# Altium footprint library Footprints.PcbLib: 50 footprints (part 3 of 4)
Each footprint in its own frame and in the unit in brackets; x right, y up, seen from the top. Pads: shape width x height; smd on the part's side, far side on the other; paste and mask are expansions set on the pad; w line width, h text height; cw(c..) or ccw(c..) is an arc to the next point about the centre after c.
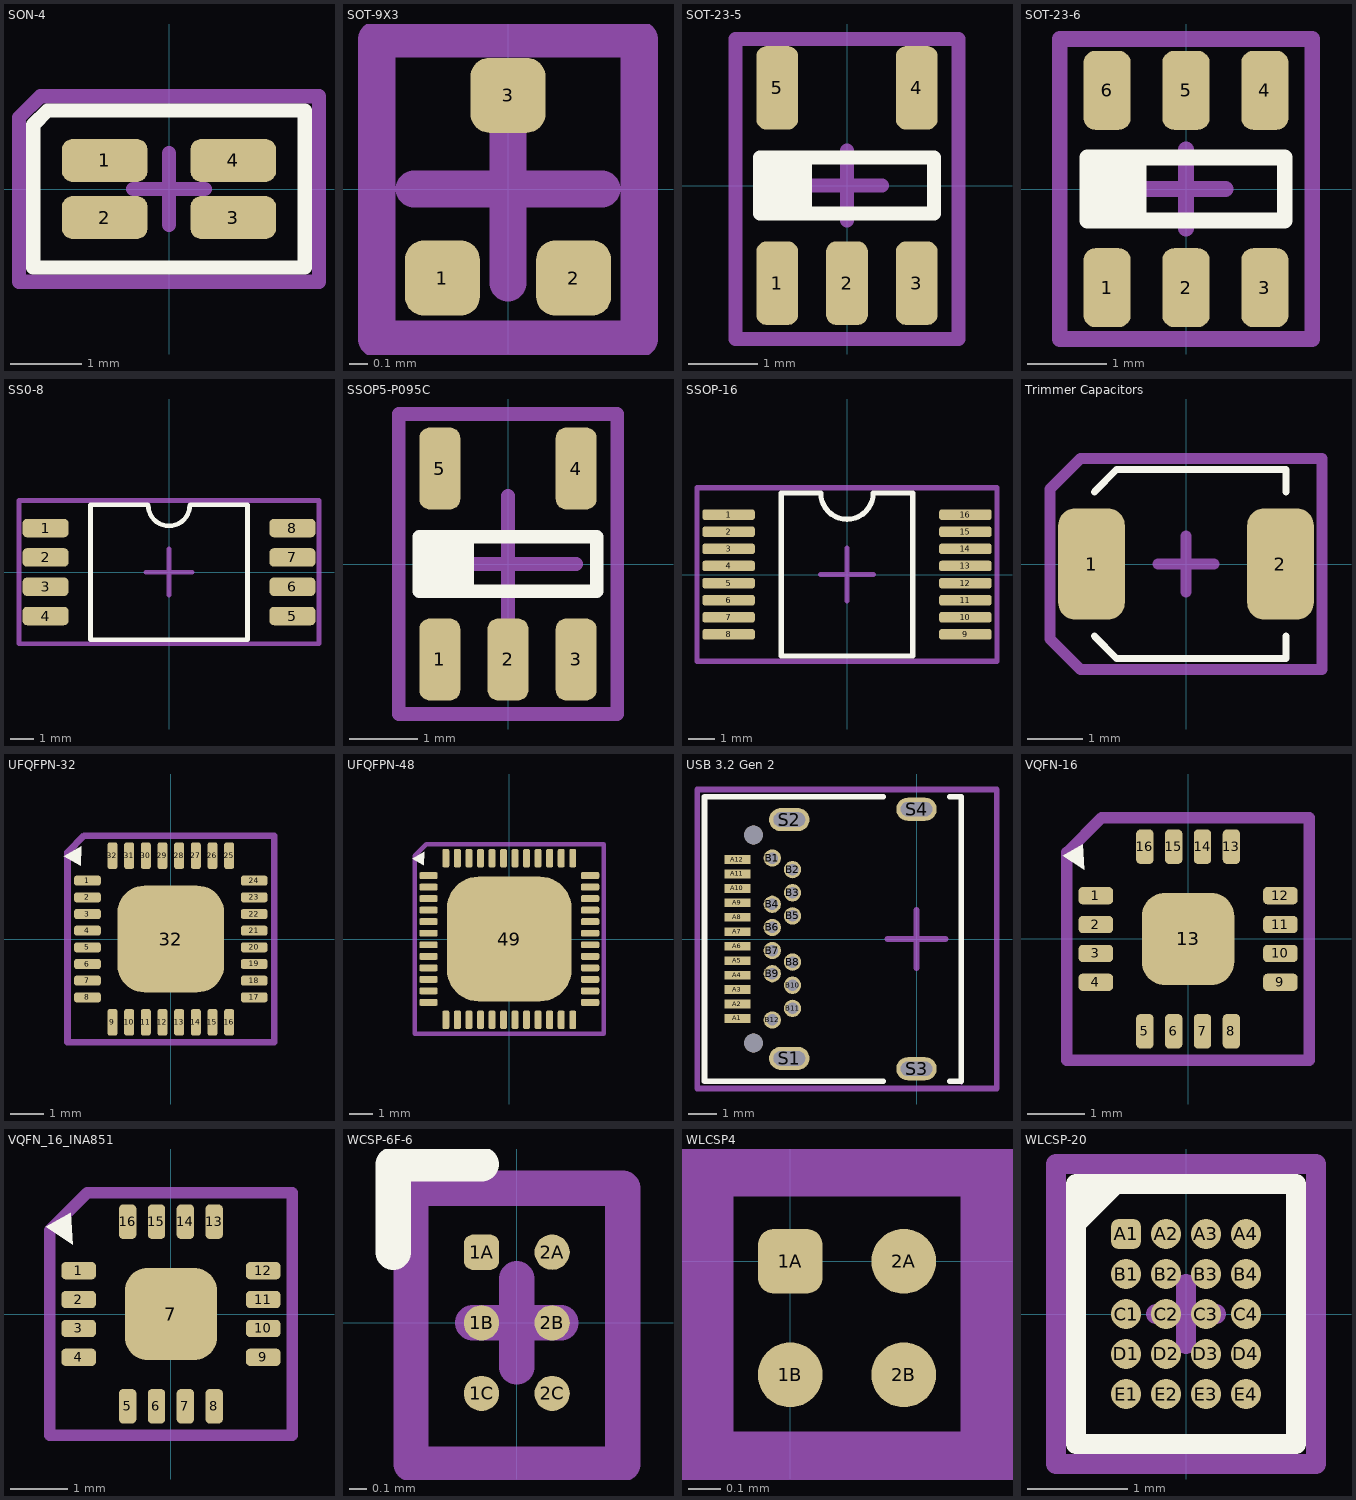
[diagram p2: the footprints below, top view; thin cyan lines are the x and y axes]

## SON-4 [mm]
pads (4):
  rrect50% 1.2x0.6 smd mask+0.051: 1(-0.9,0.4) 2(-0.9,-0.4) 3(0.9,-0.4) 4(0.9,0.4)
Top Overlay:
  lines w0.2: -1.9,-1.1 1.9,-1.1 1.9,1.1 -1.7,1.1 -1.9,0.9 -1.9,-1.1
Top Solder:
  rectangle: -1.6,-0.8 1.6,0.8
Top Assembly:
  lines w0.2: -0.5,0 0.5,0 ; 0,-0.5 0,0.5 ; -2.1,-1.3 -2.1,1 -1.8,1.3 2.1,1.3 2.1,-1.3 -2.1,-1.3
  text "'.Designator'" at -1.795,1.378 h1
3D body "VSONR4_TOS.step": height 1.4, standoff 0, extent -1.372,-0.724 1.372,0.724

## SOT-9X3 [mm]
pads (3):
  rrect50% 0.4x0.4 smd mask+0.051: 1(-0.35,-0.475) 2(0.35,-0.475) 3(0,0.5)
Top Assembly:
  lines w0.2: -0.5,0 0.5,0 ; 0,-0.5 0,0.5 ; -0.7,-0.8 -0.7,0.8 0.7,0.8 0.7,-0.8 -0.7,-0.8
  text "'.Designator'" at -1.795,0.978 h1
3D body "DRT0003A.stp": height 0.5, standoff 0, extent -0.5,-0.505 0.5,0.495

## SOT-23-5 [mm]
pads (5):
  rrect50% 0.6x1.2 smd mask+0.051: 1(-1,-1.4) 2(0,-1.4) 3(1,-1.4) 4(1,1.4) 5(-1,1.4)
Top Overlay:
  rectangle: -1.25,-0.4 -0.5,0.4
  lines w0.2: -1.25,-0.4 1.25,-0.4 1.25,0.4 -1.25,0.4 -1.25,-0.4
Top Assembly:
  lines w0.2: -0.5,0 0.5,0 ; 0,-0.5 0,0.5 ; -1.6,-2.2 -1.6,2.1 1.6,2.1 1.6,-2.2 -1.6,-2.2
  text "'.Designator'" at -1.695,2.378 h1
3D body "CircuitWorks-SOT-23-5.step": height 1.05, standoff -0.05, extent -1.5,-1.25 1.5,1.25

## SOT-23-6 [mm]
pads (6):
  rrect50% 0.6x1 smd mask+0.051: 1(-1,-1.25) 2(0,-1.25) 3(1,-1.25) 4(1,1.25) 5(0,1.25) 6(-1,1.25)
Top Overlay:
  rectangle: -1.25,-0.4 -0.5,0.4
  lines w0.2: -1.25,-0.4 -1.25,0.4 1.25,0.4 1.25,-0.4 -1.25,-0.4
Top Assembly:
  lines w0.2: -0.5,0 0.5,0 ; 0,-0.5 0,0.5 ; -1.6,-1.9 1.6,-1.9 1.6,1.9 -1.6,1.9 -1.6,-1.9
  text "'.Designator'" at -1.72,2.078 h1
3D body "User Library-SOT23-6-1.step": height 1.09, standoff 0, extent -1.397,-1.2 1.397,1.226

## SS0-8 [mm]
pads (8):
  rrect50% 2x0.8 smd mask+0.051: 1(-5.35,1.905) 2(-5.35,0.635) 3(-5.35,-0.635) 4(-5.35,-1.905) 5(5.35,-1.905) 6(5.35,-0.635) 7(5.35,0.635) 8(5.35,1.905)
Top Overlay:
  lines w0.2: -0.925,2.925 -3.404,2.925 -3.404,-2.925 3.404,-2.925 3.404,2.925 0.925,2.925 ; -0.9,2.9 ccw(c0,2.9) 0,2 ccw(c0,2.9) 0.9,2.9
Top Assembly:
  lines w0.2: -1,0 1,0 ; 0,-1 0,1 ; -6.5,-3.1 -6.5,3.1 6.5,3.1 6.5,-3.1 -6.5,-3.1
  text "'.Designator'" at -1.72,2.078 h1
3D body "User Library-SSO-8.step": height 3.09, standoff -0.29, extent -5.75,-2.85 5.75,3

## SSOP5-P095C [mm]
pads (5):
  rrect50% 0.6x1.2 smd mask+0.051: 1(-1,-1.4) 2(0,-1.4) 3(1,-1.4) 4(1,1.4) 5(-1,1.4)
Top Overlay:
  rectangle: -1.3,-0.4 -0.5,0.4
  lines w0.2: -1.3,-0.4 -1.3,0.4 1.3,0.4 1.3,-0.4 -1.3,-0.4
Top Assembly:
  lines w0.2: -1,0 1,0 ; 0,-1 0,1 ; -1.6,-2.2 1.6,-2.2 1.6,2.2 -1.6,2.2 -1.6,-2.2
  text "'.Designator'" at -1.795,2.378 h1
3D body "User Library-TC7S04F - SS05-P-0_95.step": height 1.1, standoff 0, extent -1.45,-1.4 1.45,1.4

## SSOP-16 [mm]
pads (16):
  rrect50% 2x0.4 smd mask+0.051: 1(-4.5,2.275) 2(-4.5,1.625) 3(-4.5,0.975) 4(-4.5,0.325) 5(-4.5,-0.325) 6(-4.5,-0.975) 7(-4.5,-1.625) 8(-4.5,-2.275) 9(4.5,-2.275) 10(4.5,-1.625) 11(4.5,-0.975) 12(4.5,-0.325) 13(4.5,0.325) 14(4.5,0.975) 15(4.5,1.625) 16(4.5,2.275)
Top Overlay:
  lines w0.2: 0,2.1 cw(c0,3.1) -1,3.1 -2.5,3.1 -2.5,-3.1 2.5,-3.1 2.5,3.1 1,3.1 cw(c0,3.1) 0,2.1 ; 0,2.1 0,2.1
Top Solder:
  rectangle: 3.4,-2.6 5.6,2.6
  rectangle: -5.6,-2.6 -3.4,2.6
Top Assembly:
  lines w0.2: -1,0 1,0 ; 0,-1 0,1 ; -5.7,-3.3 5.7,-3.3 5.7,3.3 -5.7,3.3 -5.7,-3.3
  text "'.Designator'" at -1.695,2.078 h1
3D body "User Library-ssop-16 pos.step": height 2.09, standoff 0.11, extent -3.95,-3.162 3.95,3.162

## Trimmer Capacitors [mm]
pads (2):
  rrect50% 1.2x2 smd mask+0.051: 1(-1.7,0) 2(1.7,0)
Top Overlay:
  lines w0.127: -1.65,-1.3 -1.249,-1.7 1.8,-1.7 1.8,-1.3 ; -1.65,1.3 -1.249,1.7 1.8,1.7 1.8,1.3
Top Assembly:
  lines w0.2: -0.5,0 0.5,0 ; 0,-0.5 0,0.5 ; -2.45,-1.35 -1.9,-1.9 2.45,-1.9 2.45,1.9 -1.9,1.9 -2.45,1.35 -2.45,-1.35
  text "'.Designator'" at -1.795,1.078 h1
3D body "User Library-CAPAE450X150M.step": height 1.5, standoff 0, extent -2.25,-1.6 2.25,1.6

## UFQFPN-32 [mm]
pads (33):
  rrect50% 0.8x0.3 smd mask+0.051: 1(-2.5,1.75) 2(-2.5,1.25) 3(-2.5,0.75) 4(-2.5,0.25) 5(-2.5,-0.25) 6(-2.5,-0.75) 7(-2.5,-1.25) 8(-2.5,-1.75) 17(2.5,-1.75) 18(2.5,-1.25) 19(2.5,-0.75) 20(2.5,-0.25) 21(2.5,0.25) 22(2.5,0.75) 23(2.5,1.25) 24(2.5,1.75)
  rrect50% 0.3x0.8 smd mask+0.051: 9(-1.75,-2.5) 10(-1.25,-2.5) 11(-0.75,-2.5) 12(-0.25,-2.5) 13(0.25,-2.5) 14(0.75,-2.5) 15(1.25,-2.5) 16(1.75,-2.5) 25(1.75,2.5) 26(1.25,2.5) 27(0.75,2.5) 28(0.25,2.5) 29(-0.25,2.5) 30(-0.75,2.5) 31(-1.25,2.5) 32(-1.75,2.5)
  rrect50% 3.2x3.2 smd mask+0.051: 32(0,0)
Top Overlay:
  region: -2.7,2.2 -2.69,2.783 -3.21,2.483
Top Solder:
  region: -2,3 -2,2 2,2 2,3
  region: 3,2 2,2 2,-2 3,-2
  region: 2,-3 2,-2 -2,-2 -2,-3
  rectangle: -3,-2 -2,2
Top Assembly:
  lines w0.2: -0.5,0 0.5,0 ; 0,-0.5 0,0.5 ; -3.1,-3.1 3.1,-3.1 3.1,3.1 -2.6,3.1 -3.1,2.6 -3.1,-3.1
  text "'.Designator'" at -1.895,3.678 h1
3D body "User Library-UFQFPN-32.step": height 0.55, standoff 0, extent -2.5,-2.5 2.5,2.5

## UFQFPN-48 [mm]
pads (49):
  rrect50% 0.8x0.3 smd mask+0.051: 1(-3.5,2.75) 2(-3.5,2.25) 3(-3.5,1.75) 4(-3.5,1.25) 5(-3.5,0.75) 6(-3.5,0.25) 7(-3.5,-0.25) 8(-3.5,-0.75) 9(-3.5,-1.25) 10(-3.5,-1.75) 11(-3.5,-2.25) 12(-3.5,-2.75) 25(3.5,-2.75) 26(3.5,-2.25) 27(3.5,-1.75) 28(3.5,-1.25) 29(3.5,-0.75) 30(3.5,-0.25) 31(3.5,0.25) 32(3.5,0.75) 33(3.5,1.25) 34(3.5,1.75) 35(3.5,2.25) 36(3.5,2.75)
  rrect50% 0.3x0.8 smd mask+0.051: 13(-2.75,-3.5) 14(-2.25,-3.5) 15(-1.75,-3.5) 16(-1.25,-3.5) 17(-0.75,-3.5) 18(-0.25,-3.5) 19(0.25,-3.5) 20(0.75,-3.5) 21(1.25,-3.5) 22(1.75,-3.5) 23(2.25,-3.5) 24(2.75,-3.5) 37(2.75,3.5) 38(2.25,3.5) 39(1.75,3.5) 40(1.25,3.5) 41(0.75,3.5) 42(0.25,3.5) 43(-0.25,3.5) 44(-0.75,3.5) 45(-1.25,3.5) 46(-1.75,3.5) 47(-2.25,3.5) 48(-2.75,3.5)
  rrect50% 5.4x5.4 smd mask+0.051: 49(0,0)
Top Overlay:
  region: -3.7,3.2 -3.69,3.783 -4.21,3.483
Top Solder:
  rectangle: -4,-3 -3,3
  region: -3,-3 -3,-4 3,-4 3,-3
  rectangle: 3,-3 4,3
  region: 3,3 3,4 -3,4 -3,3
Top Assembly:
  lines w0.2: -0.5,0 0.5,0 ; 0,-0.5 0,0.5 ; -4.1,-4.1 -4.1,3.6 -3.6,4.1 4.1,4.1 4.1,-4.1 -4.1,-4.1
  text "'.Designator'" at -1.795,4.378 h1
3D body "QFPN_491CCU6_STM.step": height 0.61, standoff 0, extent -3.556,-3.556 3.556,3.556

## USB 3.2 Gen 2 [mm]
pads (30):
  rect 0.9x0.3 smd mask+0.051: A1(-6.2,-2.75) A2(-6.2,-2.25) A3(-6.2,-1.75) A4(-6.2,-1.25) A5(-6.2,-0.75) A6(-6.2,-0.25) A7(-6.2,0.25) A8(-6.2,0.75) A9(-6.2,1.25) A10(-6.2,1.75) A11(-6.2,2.25) A12(-6.2,2.75)
  round 0.6 hole 0.4: B1(-4.99,2.8) B2(-4.29,2.4) B3(-4.29,1.6) B4(-4.99,1.2) B5(-4.29,0.8) B6(-4.99,0.4) B7(-4.99,-0.4) B8(-4.29,-0.8) B9(-4.99,-1.2) B10(-4.29,-1.6) B11(-4.29,-2.4) B12(-4.99,-2.8)
  oval 1.4x0.8 hole 0.5 slot 1.1 at 0 deg: S1(-4.4,-4.13) S2(-4.4,4.13) S3(0,-4.49) S4(0,4.49)
  round 0.65 hole 0.65 unplated: ""(-5.64,-3.6) ""(-5.64,3.6)
Top Overlay:
  lines w0.2: -1.15,-4.925 -7.34,-4.925 -7.34,4.925 -1.15,4.925 ; 1.15,-4.925 1.55,-4.925 1.55,4.925 1.15,4.925
Top Solder:
  rectangle: -6.7,-4 -3.9,4
Top Assembly:
  lines w0.1: 1.55,-5 1.55,4.75
  lines w0.2: -1,0 1,0 ; 0,-1 0,1 ; -7.59,-5.175 2.78,-5.175 2.78,5.175 -7.59,5.175 -7.59,-5.175
  text "'.Designator'" at -2.795,1.778 h1
3D body "USB4056-03-A.stp": height 3.33, standoff -1.13, extent -7.27,-4.925 2.6,4.925

## VQFN-16 [mm]
pads (17):
  rrect50% 0.6x0.3 smd mask+0.051: 1(-1.6,0.75) 2(-1.6,0.25) 3(-1.6,-0.25) 4(-1.6,-0.75) 9(1.6,-0.75) 10(1.6,-0.25) 11(1.6,0.25) 12(1.6,0.75)
  rrect50% 0.3x0.6 smd mask+0.051: 5(-0.75,-1.6) 6(-0.25,-1.6) 7(0.25,-1.6) 8(0.75,-1.6) 13(0.75,1.6) 14(0.25,1.6) 15(-0.25,1.6) 16(-0.75,1.6)
  rrect50% 1.6x1.6 smd mask+0.051: 13(0,0)
Top Overlay:
  region: -1.8,1.2 -1.827,1.646 -2.173,1.446
Top Solder:
  rectangle: -2,-1 -1.2,1
  region: -1,-1.2 -1,-2 1,-2 1,-1.2
  rectangle: 1.2,-1 2,1
  region: 1,1.2 1,2 -1,2 -1,1.2
Top Assembly:
  lines w0.2: -0.25,0 0.25,0 ; 0,-0.25 0,0.25 ; -2.1,-2.1 2.1,-2.1 2.1,2.1 -1.5,2.1 -2.1,1.5 -2.1,-2.1
  text "'.Designator'" at -1.795,2.678 h1
3D body "User Library-BQ24600RVAT.step": height 1, standoff 0.1, extent -1.75,-1.75 1.75,1.75

## VQFN_16_INA851 [mm]
pads (17):
  rrect50% 0.6x0.3 smd mask+0.051: 1(-1.6,0.75) 2(-1.6,0.25) 3(-1.6,-0.25) 4(-1.6,-0.75) 9(1.6,-0.75) 10(1.6,-0.25) 11(1.6,0.25) 12(1.6,0.75)
  rrect50% 0.3x0.6 smd mask+0.051: 5(-0.75,-1.6) 6(-0.25,-1.6) 7(0.25,-1.6) 8(0.75,-1.6) 13(0.75,1.6) 14(0.25,1.6) 15(-0.25,1.6) 16(-0.75,1.6)
  rrect50% 1.6x1.6 smd mask+0.051: 7(0,0)
Top Overlay:
  region: -1.7,1.2 -1.733,1.758 -2.167,1.508
Top Solder:
  region: 1,1.2 1,2 -1,2 -1,1.2
  rectangle: 1.2,-1 2,1
  region: -1,-1.2 -1,-2 1,-2 1,-1.2
  rectangle: -2,-1 -1.2,1
Top Assembly:
  lines w0.2: -0.5,0 0.5,0 ; 0,-0.5 0,0.5 ; -2.1,-2.1 2.1,-2.1 2.1,2.1 -1.45,2.1 -2.1,1.45 -2.1,-2.1
  text "'.Designator'" at -1.795,2.378 h1
3D body "User Library-BQ24600RVAT.step": height 1, standoff 0.1, extent -1.75,-1.75 1.75,1.75

## WCSP-6F-6 [mm]
pads (6):
  rrect50% 0.2x0.2 smd mask+0.051: 1A(-0.2,0.4)
  round 0.2 smd mask+0.051: 1B(-0.2,0) 1C(-0.2,-0.4) 2A(0.2,0.4) 2B(0.2,0) 2C(0.2,-0.4)
Top Overlay:
  lines w0.2: -0.7,0.4 -0.7,0.9 -0.2,0.9
Top Solder:
  rectangle: -0.35,-0.55 0.35,0.55
Top Assembly:
  lines w0.2: -0.25,0 0.25,0 ; 0,-0.25 0,0.25 ; -0.6,-0.8 0.6,-0.8 0.6,0.762 -0.6,0.762 -0.6,-0.8
  text "'.Designator'" at -1.795,1.128 h1
3D body "TCR15AG33_LF.step": height 0.21, standoff -0.12, extent -0.4,-0.6 0.4,0.6

## WLCSP4 [mm]
pads (4):
  rrect50% 0.2x0.2 smd mask+0.051: 1A(0,0)
  round 0.2 smd mask+0.051: 1B(0,-0.35) 2A(0.35,0) 2B(0.35,-0.35)
Top Assembly:
  lines w0.2: -0.275,-0.625 -0.275,0.3 0.625,0.3 0.625,-0.625 -0.275,-0.625
  text "'.Designator'" at -1.62,0.428 h1
3D body "User Library-WLCSP4.step": height 0.45, standoff -0.02, extent -0.15,-0.5 0.525,0.175

## WLCSP-20 [mm]
pads (20):
  rrect50% 0.3x0.3 smd mask+0.051: A1(-0.6,0.8)
  round 0.3 smd mask+0.051: A2(-0.2,0.8) A3(0.2,0.8) A4(0.6,0.8) B1(-0.6,0.4) B2(-0.2,0.4) B3(0.2,0.4) B4(0.6,0.4) C1(-0.6,0) C2(-0.2,0) C3(0.2,0) C4(0.6,0) D1(-0.6,-0.4) D2(-0.2,-0.4) D3(0.2,-0.4) D4(0.6,-0.4) E1(-0.6,-0.8) E2(-0.2,-0.8) E3(0.2,-0.8) E4(0.6,-0.8)
Top Overlay:
  lines w0.2: -1.1,0.9 -0.7,1.3 -1.1,1.3 ; -1.097,1.121 -0.9,1.3 ; -1.1,1.3 1.1,1.3 1.1,-1.3 -1.1,-1.3 -1.1,1.3
Top Assembly:
  lines w0.2: -0.3,0 0.3,0 ; 0,-0.3 0,0.3 ; -1.3,-1.5 -1.3,1.5 1.3,1.5 1.3,-1.5 -1.3,-1.5
  text "'.Designator'" at -2.5,1.524 h1
3D body "User Library-WLCSP-20 v1.step": height 0.58, standoff -0.03, extent -0.8,-1 0.8,1